# Altium integrated library WCAP-AIL8_rev15a.intlib: 34 symbols
Pins are listed as number, name and electrical type; pins without a type are passive.

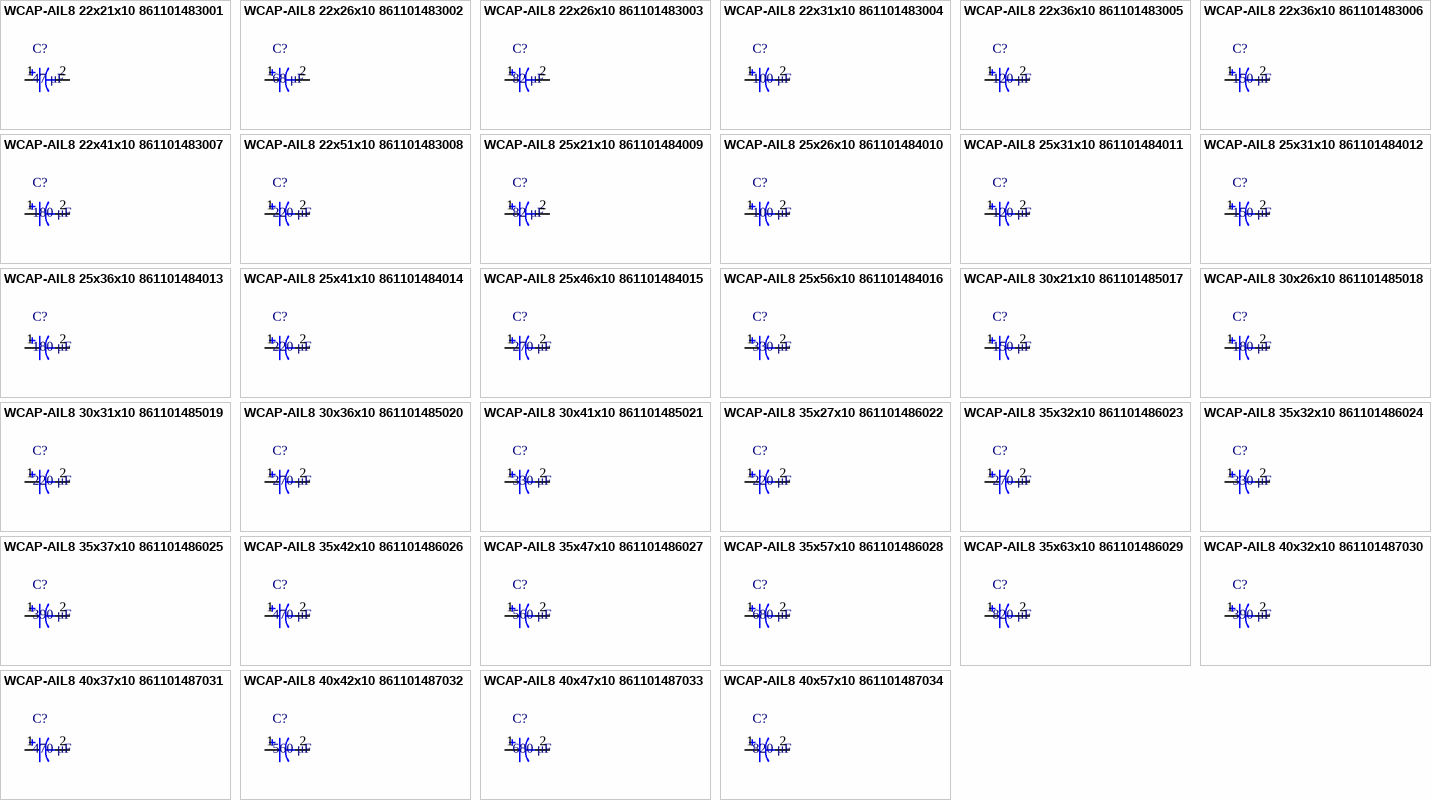
[diagram p0: symbols WCAP-AIL8 22x21x10 861101483001 to WCAP-AIL8 40x57x10 861101487034]

## WCAP-AIL8 22x21x10 861101483001
designator C?, comment 47 μF
WCAP-AIL8 Aluminum Electrolytic Capacitors , 47 μF; + / - 20%; 450 V , 22 x 21; Manufacturer: Wurth Elektronik; partNo: 861101483001; E-mail: libraries@we-online.com; Characteristics: Aluminum Electrolytic Capacitor; Recommended soldering: Wave; Operating temperature: –25 °C to +85 °C; Miniaturized product series; Load life: 2000 h @ +85 °C; ComponentLink1Description: Manufacturer; ComponentLink1URL: http://www.we-online.com; ComponentLink2Description: Datasheet; ComponentLink2URL: http://katalog.we-online.de/pbs/datasheet/861101483001.pdf; Created by: Karrer Zheng; Created Date: 6/8/2015; Capacitance: 47 μF; Application: Medium and high voltage type range from 160V-450V used as primary side input filter in power supply, which can be used in general switching power supply, PC power supply and industrial computer power supply,server power supply, AC-DC converter, motor drive circuit DC storage filter, digital audio, digital TV, communication base station, DC-AC inverter, inverter power supply and converters etc
footprint WCAP-AIL8 22x21x10
pins: 1, 2

## WCAP-AIL8 22x26x10 861101483002
designator C?, comment 68 μF
WCAP-AIL8 Aluminum Electrolytic Capacitors , 68 μF; + / - 20%; 450 V , 22 x 26; Manufacturer: Wurth Elektronik; partNo: 861101483002; E-mail: libraries@we-online.com; Characteristics: Aluminum Electrolytic Capacitor; Recommended soldering: Wave; Operating temperature: –25 °C to +85 °C; Miniaturized product series; Load life: 2000 h @ +85 °C; ComponentLink1Description: Manufacturer; ComponentLink1URL: http://www.we-online.com; ComponentLink2Description: Datasheet; ComponentLink2URL: http://katalog.we-online.de/pbs/datasheet/861101483002.pdf; Created by: Karrer Zheng; Created Date: 6/8/2015; Capacitance: 68 μF; Application: Medium and high voltage type range from 160V-450V used as primary side input filter in power supply, which can be used in general switching power supply, PC power supply and industrial computer power supply,server power supply, AC-DC converter, motor drive circuit DC storage filter, digital audio, digital TV, communication base station, DC-AC inverter, inverter power supply and converters etc
footprint WCAP-AIL8 22x26x10
pins: 1, 2

## WCAP-AIL8 22x26x10 861101483003
designator C?, comment 82 μF
WCAP-AIL8 Aluminum Electrolytic Capacitors , 82 μF; + / - 20%; 450 V , 22 x 26; Manufacturer: Wurth Elektronik; partNo: 861101483003; E-mail: libraries@we-online.com; Characteristics: Aluminum Electrolytic Capacitor; Recommended soldering: Wave; Operating temperature: –25 °C to +85 °C; Miniaturized product series; Load life: 2000 h @ +85 °C; ComponentLink1Description: Manufacturer; ComponentLink1URL: http://www.we-online.com; ComponentLink2Description: Datasheet; ComponentLink2URL: http://katalog.we-online.de/pbs/datasheet/861101483003.pdf; Created by: Karrer Zheng; Created Date: 6/8/2015; Capacitance: 82 μF; Application: Medium and high voltage type range from 160V-450V used as primary side input filter in power supply, which can be used in general switching power supply, PC power supply and industrial computer power supply,server power supply, AC-DC converter, motor drive circuit DC storage filter, digital audio, digital TV, communication base station, DC-AC inverter, inverter power supply and converters etc
footprint WCAP-AIL8 22x26x10
pins: 1, 2

## WCAP-AIL8 22x31x10 861101483004
designator C?, comment 100 μF
WCAP-AIL8 Aluminum Electrolytic Capacitors , 100 μF; + / - 20%; 450 V , 22 x 31; Manufacturer: Wurth Elektronik; partNo: 861101483004; E-mail: libraries@we-online.com; Characteristics: Aluminum Electrolytic Capacitor; Recommended soldering: Wave; Operating temperature: –25 °C to +85 °C; Miniaturized product series; Load life: 2000 h @ +85 °C; ComponentLink1Description: Manufacturer; ComponentLink1URL: http://www.we-online.com; ComponentLink2Description: Datasheet; ComponentLink2URL: http://katalog.we-online.de/pbs/datasheet/861101483004.pdf; Created by: Karrer Zheng; Created Date: 6/8/2015; Capacitance: 100 μF; Application: Medium and high voltage type range from 160V-450V used as primary side input filter in power supply, which can be used in general switching power supply, PC power supply and industrial computer power supply,server power supply, AC-DC converter, motor drive circuit DC storage filter, digital audio, digital TV, communication base station, DC-AC inverter, inverter power supply and converters etc
footprint WCAP-AIL8 22x31x10
pins: 1, 2

## WCAP-AIL8 22x36x10 861101483005
designator C?, comment 120 μF
WCAP-AIL8 Aluminum Electrolytic Capacitors , 120 μF; + / - 20%; 450 V , 22 x 36; Manufacturer: Wurth Elektronik; partNo: 861101483005; E-mail: libraries@we-online.com; Characteristics: Aluminum Electrolytic Capacitor; Recommended soldering: Wave; Operating temperature: –25 °C to +85 °C; Miniaturized product series; Load life: 2000 h @ +85 °C; ComponentLink1Description: Manufacturer; ComponentLink1URL: http://www.we-online.com; ComponentLink2Description: Datasheet; ComponentLink2URL: http://katalog.we-online.de/pbs/datasheet/861101483005.pdf; Created by: Karrer Zheng; Created Date: 6/8/2015; Capacitance: 120 μF; Application: Medium and high voltage type range from 160V-450V used as primary side input filter in power supply, which can be used in general switching power supply, PC power supply and industrial computer power supply,server power supply, AC-DC converter, motor drive circuit DC storage filter, digital audio, digital TV, communication base station, DC-AC inverter, inverter power supply and converters etc
footprint WCAP-AIL8 22x36x10
pins: 1, 2

## WCAP-AIL8 22x36x10 861101483006
designator C?, comment 150 μF
WCAP-AIL8 Aluminum Electrolytic Capacitors , 150 μF; + / - 20%; 450 V , 22 x 36; Manufacturer: Wurth Elektronik; partNo: 861101483006; E-mail: libraries@we-online.com; Characteristics: Aluminum Electrolytic Capacitor; Recommended soldering: Wave; Operating temperature: –25 °C to +85 °C; Miniaturized product series; Load life: 2000 h @ +85 °C; ComponentLink1Description: Manufacturer; ComponentLink1URL: http://www.we-online.com; ComponentLink2Description: Datasheet; ComponentLink2URL: http://katalog.we-online.de/pbs/datasheet/861101483006.pdf; Created by: Karrer Zheng; Created Date: 6/8/2015; Capacitance: 150 μF; Application: Medium and high voltage type range from 160V-450V used as primary side input filter in power supply, which can be used in general switching power supply, PC power supply and industrial computer power supply,server power supply, AC-DC converter, motor drive circuit DC storage filter, digital audio, digital TV, communication base station, DC-AC inverter, inverter power supply and converters etc
footprint WCAP-AIL8 22x36x10
pins: 1, 2

## WCAP-AIL8 22x41x10 861101483007
designator C?, comment 180 μF
WCAP-AIL8 Aluminum Electrolytic Capacitors , 180 μF; + / - 20%; 450 V , 22 x 41; Manufacturer: Wurth Elektronik; partNo: 861101483007; E-mail: libraries@we-online.com; Characteristics: Aluminum Electrolytic Capacitor; Recommended soldering: Wave; Operating temperature: –25 °C to +85 °C; Miniaturized product series; Load life: 2000 h @ +85 °C; ComponentLink1Description: Manufacturer; ComponentLink1URL: http://www.we-online.com; ComponentLink2Description: Datasheet; ComponentLink2URL: http://katalog.we-online.de/pbs/datasheet/861101483007.pdf; Created by: Karrer Zheng; Created Date: 6/8/2015; Capacitance: 180 μF; Application: Medium and high voltage type range from 160V-450V used as primary side input filter in power supply, which can be used in general switching power supply, PC power supply and industrial computer power supply,server power supply, AC-DC converter, motor drive circuit DC storage filter, digital audio, digital TV, communication base station, DC-AC inverter, inverter power supply and converters etc
footprint WCAP-AIL8 22x41x10
pins: 1, 2

## WCAP-AIL8 22x51x10 861101483008
designator C?, comment 220 μF
WCAP-AIL8 Aluminum Electrolytic Capacitors , 220 μF; + / - 20%; 450 V , 22 x 51; Manufacturer: Wurth Elektronik; partNo: 861101483008; E-mail: libraries@we-online.com; Characteristics: Aluminum Electrolytic Capacitor; Recommended soldering: Wave; Operating temperature: –25 °C to +85 °C; Miniaturized product series; Load life: 2000 h @ +85 °C; ComponentLink1Description: Manufacturer; ComponentLink1URL: http://www.we-online.com; ComponentLink2Description: Datasheet; ComponentLink2URL: http://katalog.we-online.de/pbs/datasheet/861101483008.pdf; Created by: Karrer Zheng; Created Date: 6/8/2015; Capacitance: 220 μF; Application: Medium and high voltage type range from 160V-450V used as primary side input filter in power supply, which can be used in general switching power supply, PC power supply and industrial computer power supply,server power supply, AC-DC converter, motor drive circuit DC storage filter, digital audio, digital TV, communication base station, DC-AC inverter, inverter power supply and converters etc
footprint WCAP-AIL8 22x51x10
pins: 1, 2

## WCAP-AIL8 25x21x10 861101484009
designator C?, comment 82 μF
WCAP-AIL8 Aluminum Electrolytic Capacitors , 82 μF; + / - 20%; 450 V , 25 x 21; Manufacturer: Wurth Elektronik; partNo: 861101484009; E-mail: libraries@we-online.com; Characteristics: Aluminum Electrolytic Capacitor; Recommended soldering: Wave; Operating temperature: –25 °C to +85 °C; Miniaturized product series; Load life: 2000 h @ +85 °C; ComponentLink1Description: Manufacturer; ComponentLink1URL: http://www.we-online.com; ComponentLink2Description: Datasheet; ComponentLink2URL: http://katalog.we-online.de/pbs/datasheet/861101484009.pdf; Created by: Karrer Zheng; Created Date: 6/8/2015; Capacitance: 82 μF; Application: Medium and high voltage type range from 160V-450V used as primary side input filter in power supply, which can be used in general switching power supply, PC power supply and industrial computer power supply,server power supply, AC-DC converter, motor drive circuit DC storage filter, digital audio, digital TV, communication base station, DC-AC inverter, inverter power supply and converters etc
footprint WCAP-AIL8 25x21x10
pins: 1, 2

## WCAP-AIL8 25x26x10 861101484010
designator C?, comment 100 μF
WCAP-AIL8 Aluminum Electrolytic Capacitors , 100 μF; + / - 20%; 450 V , 25 x 26; Manufacturer: Wurth Elektronik; partNo: 861101484010; E-mail: libraries@we-online.com; Characteristics: Aluminum Electrolytic Capacitor; Recommended soldering: Wave; Operating temperature: –25 °C to +85 °C; Miniaturized product series; Load life: 2000 h @ +85 °C; ComponentLink1Description: Manufacturer; ComponentLink1URL: http://www.we-online.com; ComponentLink2Description: Datasheet; ComponentLink2URL: http://katalog.we-online.de/pbs/datasheet/861101484010.pdf; Created by: Karrer Zheng; Created Date: 6/8/2015; Capacitance: 100 μF; Application: Medium and high voltage type range from 160V-450V used as primary side input filter in power supply, which can be used in general switching power supply, PC power supply and industrial computer power supply,server power supply, AC-DC converter, motor drive circuit DC storage filter, digital audio, digital TV, communication base station, DC-AC inverter, inverter power supply and converters etc
footprint WCAP-AIL8 25x26x10
pins: 1, 2

## WCAP-AIL8 25x31x10 861101484011
designator C?, comment 120 μF
WCAP-AIL8 Aluminum Electrolytic Capacitors , 120 μF; + / - 20%; 450 V , 25 x 31; Manufacturer: Wurth Elektronik; partNo: 861101484011; E-mail: libraries@we-online.com; Characteristics: Aluminum Electrolytic Capacitor; Recommended soldering: Wave; Operating temperature: –25 °C to +85 °C; Miniaturized product series; Load life: 2000 h @ +85 °C; ComponentLink1Description: Manufacturer; ComponentLink1URL: http://www.we-online.com; ComponentLink2Description: Datasheet; ComponentLink2URL: http://katalog.we-online.de/pbs/datasheet/861101484011.pdf; Created by: Karrer Zheng; Created Date: 6/8/2015; Capacitance: 120 μF; Application: Medium and high voltage type range from 160V-450V used as primary side input filter in power supply, which can be used in general switching power supply, PC power supply and industrial computer power supply,server power supply, AC-DC converter, motor drive circuit DC storage filter, digital audio, digital TV, communication base station, DC-AC inverter, inverter power supply and converters etc
footprint WCAP-AIL8 25x31x10
pins: 1, 2

## WCAP-AIL8 25x31x10 861101484012
designator C?, comment 150 μF
WCAP-AIL8 Aluminum Electrolytic Capacitors , 150 μF; + / - 20%; 450 V , 25 x 31; Manufacturer: Wurth Elektronik; partNo: 861101484012; E-mail: libraries@we-online.com; Characteristics: Aluminum Electrolytic Capacitor; Recommended soldering: Wave; Operating temperature: –25 °C to +85 °C; Miniaturized product series; Load life: 2000 h @ +85 °C; ComponentLink1Description: Manufacturer; ComponentLink1URL: http://www.we-online.com; ComponentLink2Description: Datasheet; ComponentLink2URL: http://katalog.we-online.de/pbs/datasheet/861101484012.pdf; Created by: Karrer Zheng; Created Date: 6/8/2015; Capacitance: 150 μF; Application: Medium and high voltage type range from 160V-450V used as primary side input filter in power supply, which can be used in general switching power supply, PC power supply and industrial computer power supply,server power supply, AC-DC converter, motor drive circuit DC storage filter, digital audio, digital TV, communication base station, DC-AC inverter, inverter power supply and converters etc
footprint WCAP-AIL8 25x31x10
pins: 1, 2

## WCAP-AIL8 25x36x10 861101484013
designator C?, comment 180 μF
WCAP-AIL8 Aluminum Electrolytic Capacitors , 180 μF; + / - 20%; 450 V , 25 x 36; Manufacturer: Wurth Elektronik; partNo: 861101484013; E-mail: libraries@we-online.com; Characteristics: Aluminum Electrolytic Capacitor; Recommended soldering: Wave; Operating temperature: –25 °C to +85 °C; Miniaturized product series; Load life: 2000 h @ +85 °C; ComponentLink1Description: Manufacturer; ComponentLink1URL: http://www.we-online.com; ComponentLink2Description: Datasheet; ComponentLink2URL: http://katalog.we-online.de/pbs/datasheet/861101484013.pdf; Created by: Karrer Zheng; Created Date: 6/8/2015; Capacitance: 180 μF; Application: Medium and high voltage type range from 160V-450V used as primary side input filter in power supply, which can be used in general switching power supply, PC power supply and industrial computer power supply,server power supply, AC-DC converter, motor drive circuit DC storage filter, digital audio, digital TV, communication base station, DC-AC inverter, inverter power supply and converters etc
footprint WCAP-AIL8 25x36x10
pins: 1, 2

## WCAP-AIL8 25x41x10 861101484014
designator C?, comment 220 μF
WCAP-AIL8 Aluminum Electrolytic Capacitors , 220 μF; + / - 20%; 450 V , 25 x 41; Manufacturer: Wurth Elektronik; partNo: 861101484014; E-mail: libraries@we-online.com; Characteristics: Aluminum Electrolytic Capacitor; Recommended soldering: Wave; Operating temperature: –25 °C to +85 °C; Miniaturized product series; Load life: 2000 h @ +85 °C; ComponentLink1Description: Manufacturer; ComponentLink1URL: http://www.we-online.com; ComponentLink2Description: Datasheet; ComponentLink2URL: http://katalog.we-online.de/pbs/datasheet/861101484014.pdf; Created by: Karrer Zheng; Created Date: 6/8/2015; Capacitance: 220 μF; Application: Medium and high voltage type range from 160V-450V used as primary side input filter in power supply, which can be used in general switching power supply, PC power supply and industrial computer power supply,server power supply, AC-DC converter, motor drive circuit DC storage filter, digital audio, digital TV, communication base station, DC-AC inverter, inverter power supply and converters etc
footprint WCAP-AIL8 25x41x10
pins: 1, 2

## WCAP-AIL8 25x46x10 861101484015
designator C?, comment 270 μF
WCAP-AIL8 Aluminum Electrolytic Capacitors , 270 μF; + / - 20%; 450 V , 25 x 46; Manufacturer: Wurth Elektronik; partNo: 861101484015; E-mail: libraries@we-online.com; Characteristics: Aluminum Electrolytic Capacitor; Recommended soldering: Wave; Operating temperature: –25 °C to +85 °C; Miniaturized product series; Load life: 2000 h @ +85 °C; ComponentLink1Description: Manufacturer; ComponentLink1URL: http://www.we-online.com; ComponentLink2Description: Datasheet; ComponentLink2URL: http://katalog.we-online.de/pbs/datasheet/861101484015.pdf; Created by: Karrer Zheng; Created Date: 6/8/2015; Capacitance: 270 μF; Application: Medium and high voltage type range from 160V-450V used as primary side input filter in power supply, which can be used in general switching power supply, PC power supply and industrial computer power supply,server power supply, AC-DC converter, motor drive circuit DC storage filter, digital audio, digital TV, communication base station, DC-AC inverter, inverter power supply and converters etc
footprint WCAP-AIL8 25x46x10
pins: 1, 2

## WCAP-AIL8 25x56x10 861101484016
designator C?, comment 330 μF
WCAP-AIL8 Aluminum Electrolytic Capacitors , 330 μF; + / - 20%; 450 V , 25 x 56; Manufacturer: Wurth Elektronik; partNo: 861101484016; E-mail: libraries@we-online.com; Characteristics: Aluminum Electrolytic Capacitor; Recommended soldering: Wave; Operating temperature: –25 °C to +85 °C; Miniaturized product series; Load life: 2000 h @ +85 °C; ComponentLink1Description: Manufacturer; ComponentLink1URL: http://www.we-online.com; ComponentLink2Description: Datasheet; ComponentLink2URL: http://katalog.we-online.de/pbs/datasheet/861101484016.pdf; Created by: Karrer Zheng; Created Date: 6/8/2015; Capacitance: 330 μF; Application: Medium and high voltage type range from 160V-450V used as primary side input filter in power supply, which can be used in general switching power supply, PC power supply and industrial computer power supply,server power supply, AC-DC converter, motor drive circuit DC storage filter, digital audio, digital TV, communication base station, DC-AC inverter, inverter power supply and converters etc
footprint WCAP-AIL8 25x56x10
pins: 1, 2

## WCAP-AIL8 30x21x10 861101485017
designator C?, comment 150 μF
WCAP-AIL8 Aluminum Electrolytic Capacitors , 150 μF; + / - 20%; 450 V , 30 x 21; Manufacturer: Wurth Elektronik; partNo: 861101485017; E-mail: libraries@we-online.com; Characteristics: Aluminum Electrolytic Capacitor; Recommended soldering: Wave; Operating temperature: –25 °C to +85 °C; Miniaturized product series; Load life: 2000 h @ +85 °C; ComponentLink1Description: Manufacturer; ComponentLink1URL: http://www.we-online.com; ComponentLink2Description: Datasheet; ComponentLink2URL: http://katalog.we-online.de/pbs/datasheet/861101485017.pdf; Created by: Karrer Zheng; Created Date: 6/8/2015; Capacitance: 150 μF; Application: Medium and high voltage type range from 160V-450V used as primary side input filter in power supply, which can be used in general switching power supply, PC power supply and industrial computer power supply,server power supply, AC-DC converter, motor drive circuit DC storage filter, digital audio, digital TV, communication base station, DC-AC inverter, inverter power supply and converters etc
footprint WCAP-AIL8 30x21x10
pins: 1, 2

## WCAP-AIL8 30x26x10 861101485018
designator C?, comment 180 μF
WCAP-AIL8 Aluminum Electrolytic Capacitors , 180 μF; + / - 20%; 450 V , 30 x 26; Manufacturer: Wurth Elektronik; partNo: 861101485018; E-mail: libraries@we-online.com; Characteristics: Aluminum Electrolytic Capacitor; Recommended soldering: Wave; Operating temperature: –25 °C to +85 °C; Miniaturized product series; Load life: 2000 h @ +85 °C; ComponentLink1Description: Manufacturer; ComponentLink1URL: http://www.we-online.com; ComponentLink2Description: Datasheet; ComponentLink2URL: http://katalog.we-online.de/pbs/datasheet/861101485018.pdf; Created by: Karrer Zheng; Created Date: 6/8/2015; Capacitance: 180 μF; Application: Medium and high voltage type range from 160V-450V used as primary side input filter in power supply, which can be used in general switching power supply, PC power supply and industrial computer power supply,server power supply, AC-DC converter, motor drive circuit DC storage filter, digital audio, digital TV, communication base station, DC-AC inverter, inverter power supply and converters etc
footprint WCAP-AIL8 30x26x10
pins: 1, 2

## WCAP-AIL8 30x31x10 861101485019
designator C?, comment 220 μF
WCAP-AIL8 Aluminum Electrolytic Capacitors , 220 μF; + / - 20%; 450 V , 30 x 31; Manufacturer: Wurth Elektronik; partNo: 861101485019; E-mail: libraries@we-online.com; Characteristics: Aluminum Electrolytic Capacitor; Recommended soldering: Wave; Operating temperature: –25 °C to +85 °C; Miniaturized product series; Load life: 2000 h @ +85 °C; ComponentLink1Description: Manufacturer; ComponentLink1URL: http://www.we-online.com; ComponentLink2Description: Datasheet; ComponentLink2URL: http://katalog.we-online.de/pbs/datasheet/861101485019.pdf; Created by: Karrer Zheng; Created Date: 6/8/2015; Capacitance: 220 μF; Application: Medium and high voltage type range from 160V-450V used as primary side input filter in power supply, which can be used in general switching power supply, PC power supply and industrial computer power supply,server power supply, AC-DC converter, motor drive circuit DC storage filter, digital audio, digital TV, communication base station, DC-AC inverter, inverter power supply and converters etc
footprint WCAP-AIL8 30x31x10
pins: 1, 2

## WCAP-AIL8 30x36x10 861101485020
designator C?, comment 270 μF
WCAP-AIL8 Aluminum Electrolytic Capacitors , 270 μF; + / - 20%; 450 V , 30 x 36; Manufacturer: Wurth Elektronik; partNo: 861101485020; E-mail: libraries@we-online.com; Characteristics: Aluminum Electrolytic Capacitor; Recommended soldering: Wave; Operating temperature: –25 °C to +85 °C; Miniaturized product series; Load life: 2000 h @ +85 °C; ComponentLink1Description: Manufacturer; ComponentLink1URL: http://www.we-online.com; ComponentLink2Description: Datasheet; ComponentLink2URL: http://katalog.we-online.de/pbs/datasheet/861101485020.pdf; Created by: Karrer Zheng; Created Date: 6/8/2015; Capacitance: 270 μF; Application: Medium and high voltage type range from 160V-450V used as primary side input filter in power supply, which can be used in general switching power supply, PC power supply and industrial computer power supply,server power supply, AC-DC converter, motor drive circuit DC storage filter, digital audio, digital TV, communication base station, DC-AC inverter, inverter power supply and converters etc
footprint WCAP-AIL8 30x36x10
pins: 1, 2

## WCAP-AIL8 30x41x10 861101485021
designator C?, comment 330 μF
WCAP-AIL8 Aluminum Electrolytic Capacitors , 330 μF; + / - 20%; 450 V , 30 x 41; Manufacturer: Wurth Elektronik; partNo: 861101485021; E-mail: libraries@we-online.com; Characteristics: Aluminum Electrolytic Capacitor; Recommended soldering: Wave; Operating temperature: –25 °C to +85 °C; Miniaturized product series; Load life: 2000 h @ +85 °C; ComponentLink1Description: Manufacturer; ComponentLink1URL: http://www.we-online.com; ComponentLink2Description: Datasheet; ComponentLink2URL: http://katalog.we-online.de/pbs/datasheet/861101485021.pdf; Created by: Karrer Zheng; Created Date: 6/8/2015; Capacitance: 330 μF; Application: Medium and high voltage type range from 160V-450V used as primary side input filter in power supply, which can be used in general switching power supply, PC power supply and industrial computer power supply,server power supply, AC-DC converter, motor drive circuit DC storage filter, digital audio, digital TV, communication base station, DC-AC inverter, inverter power supply and converters etc
footprint WCAP-AIL8 30x41x10
pins: 1, 2

## WCAP-AIL8 35x27x10 861101486022
designator C?, comment 220 μF
WCAP-AIL8 Aluminum Electrolytic Capacitors , 220 μF; + / - 20%; 450 V , 35 x 27; Manufacturer: Wurth Elektronik; partNo: 861101486022; E-mail: libraries@we-online.com; Characteristics: Aluminum Electrolytic Capacitor; Recommended soldering: Wave; Operating temperature: –25 °C to +85 °C; Miniaturized product series; Load life: 2000 h @ +85 °C; ComponentLink1Description: Manufacturer; ComponentLink1URL: http://www.we-online.com; ComponentLink2Description: Datasheet; ComponentLink2URL: http://katalog.we-online.de/pbs/datasheet/861101486022.pdf; Created by: Karrer Zheng; Created Date: 6/8/2015; Capacitance: 220 μF; Application: Medium and high voltage type range from 160V-450V used as primary side input filter in power supply, which can be used in general switching power supply, PC power supply and industrial computer power supply,server power supply, AC-DC converter, motor drive circuit DC storage filter, digital audio, digital TV, communication base station, DC-AC inverter, inverter power supply and converters etc
footprint WCAP-AIL8 35x27x10
pins: 1, 2

## WCAP-AIL8 35x32x10 861101486023
designator C?, comment 270 μF
WCAP-AIL8 Aluminum Electrolytic Capacitors , 270 μF; + / - 20%; 450 V , 35 x 32; Manufacturer: Wurth Elektronik; partNo: 861101486023; E-mail: libraries@we-online.com; Characteristics: Aluminum Electrolytic Capacitor; Recommended soldering: Wave; Operating temperature: –25 °C to +85 °C; Miniaturized product series; Load life: 2000 h @ +85 °C; ComponentLink1Description: Manufacturer; ComponentLink1URL: http://www.we-online.com; ComponentLink2Description: Datasheet; ComponentLink2URL: http://katalog.we-online.de/pbs/datasheet/861101486023.pdf; Created by: Karrer Zheng; Created Date: 6/8/2015; Capacitance: 270 μF; Application: Medium and high voltage type range from 160V-450V used as primary side input filter in power supply, which can be used in general switching power supply, PC power supply and industrial computer power supply,server power supply, AC-DC converter, motor drive circuit DC storage filter, digital audio, digital TV, communication base station, DC-AC inverter, inverter power supply and converters etc
footprint WCAP-AIL8 35x32x10
pins: 1, 2

## WCAP-AIL8 35x32x10 861101486024
designator C?, comment 330 μF
WCAP-AIL8 Aluminum Electrolytic Capacitors , 330 μF; + / - 20%; 450 V , 35 x 32; Manufacturer: Wurth Elektronik; partNo: 861101486024; E-mail: libraries@we-online.com; Characteristics: Aluminum Electrolytic Capacitor; Recommended soldering: Wave; Operating temperature: –25 °C to +85 °C; Miniaturized product series; Load life: 2000 h @ +85 °C; ComponentLink1Description: Manufacturer; ComponentLink1URL: http://www.we-online.com; ComponentLink2Description: Datasheet; ComponentLink2URL: http://katalog.we-online.de/pbs/datasheet/861101486024.pdf; Created by: Karrer Zheng; Created Date: 6/8/2015; Capacitance: 330 μF; Application: Medium and high voltage type range from 160V-450V used as primary side input filter in power supply, which can be used in general switching power supply, PC power supply and industrial computer power supply,server power supply, AC-DC converter, motor drive circuit DC storage filter, digital audio, digital TV, communication base station, DC-AC inverter, inverter power supply and converters etc
footprint WCAP-AIL8 35x32x10
pins: 1, 2

## WCAP-AIL8 35x37x10 861101486025
designator C?, comment 390 μF
WCAP-AIL8 Aluminum Electrolytic Capacitors , 390 μF; + / - 20%; 450 V , 35 x 37; Manufacturer: Wurth Elektronik; partNo: 861101486025; E-mail: libraries@we-online.com; Characteristics: Aluminum Electrolytic Capacitor; Recommended soldering: Wave; Operating temperature: –25 °C to +85 °C; Miniaturized product series; Load life: 2000 h @ +85 °C; ComponentLink1Description: Manufacturer; ComponentLink1URL: http://www.we-online.com; ComponentLink2Description: Datasheet; ComponentLink2URL: http://katalog.we-online.de/pbs/datasheet/861101486025.pdf; Created by: Karrer Zheng; Created Date: 6/8/2015; Capacitance: 390 μF; Application: Medium and high voltage type range from 160V-450V used as primary side input filter in power supply, which can be used in general switching power supply, PC power supply and industrial computer power supply,server power supply, AC-DC converter, motor drive circuit DC storage filter, digital audio, digital TV, communication base station, DC-AC inverter, inverter power supply and converters etc
footprint WCAP-AIL8 35x37x10
pins: 1, 2

## WCAP-AIL8 35x42x10 861101486026
designator C?, comment 470 μF
WCAP-AIL8 Aluminum Electrolytic Capacitors , 470 μF; + / - 20%; 450 V , 35 x 42; Manufacturer: Wurth Elektronik; partNo: 861101486026; E-mail: libraries@we-online.com; Characteristics: Aluminum Electrolytic Capacitor; Recommended soldering: Wave; Operating temperature: –25 °C to +85 °C; Miniaturized product series; Load life: 2000 h @ +85 °C; ComponentLink1Description: Manufacturer; ComponentLink1URL: http://www.we-online.com; ComponentLink2Description: Datasheet; ComponentLink2URL: http://katalog.we-online.de/pbs/datasheet/861101486026.pdf; Created by: Karrer Zheng; Created Date: 6/8/2015; Capacitance: 470 μF; Application: Medium and high voltage type range from 160V-450V used as primary side input filter in power supply, which can be used in general switching power supply, PC power supply and industrial computer power supply,server power supply, AC-DC converter, motor drive circuit DC storage filter, digital audio, digital TV, communication base station, DC-AC inverter, inverter power supply and converters etc
footprint WCAP-AIL8 35x42x10
pins: 1, 2

## WCAP-AIL8 35x47x10 861101486027
designator C?, comment 560 μF
WCAP-AIL8 Aluminum Electrolytic Capacitors , 560 μF; + / - 20%; 450 V , 35 x 47; Manufacturer: Wurth Elektronik; partNo: 861101486027; E-mail: libraries@we-online.com; Characteristics: Aluminum Electrolytic Capacitor; Recommended soldering: Wave; Operating temperature: –25 °C to +85 °C; Miniaturized product series; Load life: 2000 h @ +85 °C; ComponentLink1Description: Manufacturer; ComponentLink1URL: http://www.we-online.com; ComponentLink2Description: Datasheet; ComponentLink2URL: http://katalog.we-online.de/pbs/datasheet/861101486027.pdf; Created by: Karrer Zheng; Created Date: 6/8/2015; Capacitance: 560 μF; Application: Medium and high voltage type range from 160V-450V used as primary side input filter in power supply, which can be used in general switching power supply, PC power supply and industrial computer power supply,server power supply, AC-DC converter, motor drive circuit DC storage filter, digital audio, digital TV, communication base station, DC-AC inverter, inverter power supply and converters etc
footprint WCAP-AIL8 35x47x10
pins: 1, 2

## WCAP-AIL8 35x57x10 861101486028
designator C?, comment 680 μF
WCAP-AIL8 Aluminum Electrolytic Capacitors , 680 μF; + / - 20%; 450 V , 35 x 57; Manufacturer: Wurth Elektronik; partNo: 861101486028; E-mail: libraries@we-online.com; Characteristics: Aluminum Electrolytic Capacitor; Recommended soldering: Wave; Operating temperature: –25 °C to +85 °C; Miniaturized product series; Load life: 2000 h @ +85 °C; ComponentLink1Description: Manufacturer; ComponentLink1URL: http://www.we-online.com; ComponentLink2Description: Datasheet; ComponentLink2URL: http://katalog.we-online.de/pbs/datasheet/861101486028.pdf; Created by: Karrer Zheng; Created Date: 6/8/2015; Capacitance: 680 μF; Application: Medium and high voltage type range from 160V-450V used as primary side input filter in power supply, which can be used in general switching power supply, PC power supply and industrial computer power supply,server power supply, AC-DC converter, motor drive circuit DC storage filter, digital audio, digital TV, communication base station, DC-AC inverter, inverter power supply and converters etc
footprint WCAP-AIL8 35x57x10
pins: 1, 2

## WCAP-AIL8 35x63x10 861101486029
designator C?, comment 820 μF
WCAP-AIL8 Aluminum Electrolytic Capacitors , 820 μF; + / - 20%; 450 V , 35 x 63; Manufacturer: Wurth Elektronik; partNo: 861101486029; E-mail: libraries@we-online.com; Characteristics: Aluminum Electrolytic Capacitor; Recommended soldering: Wave; Operating temperature: –25 °C to +85 °C; Miniaturized product series; Load life: 2000 h @ +85 °C; ComponentLink1Description: Manufacturer; ComponentLink1URL: http://www.we-online.com; ComponentLink2Description: Datasheet; ComponentLink2URL: http://katalog.we-online.de/pbs/datasheet/861101486029.pdf; Created by: Karrer Zheng; Created Date: 6/8/2015; Capacitance: 820 μF; Application: Medium and high voltage type range from 160V-450V used as primary side input filter in power supply, which can be used in general switching power supply, PC power supply and industrial computer power supply,server power supply, AC-DC converter, motor drive circuit DC storage filter, digital audio, digital TV, communication base station, DC-AC inverter, inverter power supply and converters etc
footprint WCAP-AIL8 35x63x10
pins: 1, 2

## WCAP-AIL8 40x32x10 861101487030
designator C?, comment 390 μF
WCAP-AIL8 Aluminum Electrolytic Capacitors , 390 μF; + / - 20%; 450 V , 40 x 32; Manufacturer: Wurth Elektronik; partNo: 861101487030; E-mail: libraries@we-online.com; Characteristics: Aluminum Electrolytic Capacitor; Recommended soldering: Wave; Operating temperature: –25 °C to +85 °C; Miniaturized product series; Load life: 2000 h @ +85 °C; ComponentLink1Description: Manufacturer; ComponentLink1URL: http://www.we-online.com; ComponentLink2Description: Datasheet; ComponentLink2URL: http://katalog.we-online.de/pbs/datasheet/861101487030.pdf; Created by: Karrer Zheng; Created Date: 6/8/2015; Capacitance: 390 μF; Application: Medium and high voltage type range from 160V-450V used as primary side input filter in power supply, which can be used in general switching power supply, PC power supply and industrial computer power supply,server power supply, AC-DC converter, motor drive circuit DC storage filter, digital audio, digital TV, communication base station, DC-AC inverter, inverter power supply and converters etc
footprint WCAP-AIL8 40x32x10
pins: 1, 2

## WCAP-AIL8 40x37x10 861101487031
designator C?, comment 470 μF
WCAP-AIL8 Aluminum Electrolytic Capacitors , 470 μF; + / - 20%; 450 V , 40 x 37; Manufacturer: Wurth Elektronik; partNo: 861101487031; E-mail: libraries@we-online.com; Characteristics: Aluminum Electrolytic Capacitor; Recommended soldering: Wave; Operating temperature: –25 °C to +85 °C; Miniaturized product series; Load life: 2000 h @ +85 °C; ComponentLink1Description: Manufacturer; ComponentLink1URL: http://www.we-online.com; ComponentLink2Description: Datasheet; ComponentLink2URL: http://katalog.we-online.de/pbs/datasheet/861101487031.pdf; Created by: Karrer Zheng; Created Date: 6/8/2015; Capacitance: 470 μF; Application: Medium and high voltage type range from 160V-450V used as primary side input filter in power supply, which can be used in general switching power supply, PC power supply and industrial computer power supply,server power supply, AC-DC converter, motor drive circuit DC storage filter, digital audio, digital TV, communication base station, DC-AC inverter, inverter power supply and converters etc
footprint WCAP-AIL8 40x37x10
pins: 1, 2

## WCAP-AIL8 40x42x10 861101487032
designator C?, comment 560 μF
WCAP-AIL8 Aluminum Electrolytic Capacitors , 560 μF; + / - 20%; 450 V , 40 x 42; Manufacturer: Wurth Elektronik; partNo: 861101487032; E-mail: libraries@we-online.com; Characteristics: Aluminum Electrolytic Capacitor; Recommended soldering: Wave; Operating temperature: –25 °C to +85 °C; Miniaturized product series; Load life: 2000 h @ +85 °C; ComponentLink1Description: Manufacturer; ComponentLink1URL: http://www.we-online.com; ComponentLink2Description: Datasheet; ComponentLink2URL: http://katalog.we-online.de/pbs/datasheet/861101487032.pdf; Created by: Karrer Zheng; Created Date: 6/8/2015; Capacitance: 560 μF; Application: Medium and high voltage type range from 160V-450V used as primary side input filter in power supply, which can be used in general switching power supply, PC power supply and industrial computer power supply,server power supply, AC-DC converter, motor drive circuit DC storage filter, digital audio, digital TV, communication base station, DC-AC inverter, inverter power supply and converters etc
footprint WCAP-AIL8 40x42x10
pins: 1, 2

## WCAP-AIL8 40x47x10 861101487033
designator C?, comment 680 μF
WCAP-AIL8 Aluminum Electrolytic Capacitors , 680 μF; + / - 20%; 450 V , 40 x 47; Manufacturer: Wurth Elektronik; partNo: 861101487033; E-mail: libraries@we-online.com; Characteristics: Aluminum Electrolytic Capacitor; Recommended soldering: Wave; Operating temperature: –25 °C to +85 °C; Miniaturized product series; Load life: 2000 h @ +85 °C; ComponentLink1Description: Manufacturer; ComponentLink1URL: http://www.we-online.com; ComponentLink2Description: Datasheet; ComponentLink2URL: http://katalog.we-online.de/pbs/datasheet/861101487033.pdf; Created by: Karrer Zheng; Created Date: 6/8/2015; Capacitance: 680 μF; Application: Medium and high voltage type range from 160V-450V used as primary side input filter in power supply, which can be used in general switching power supply, PC power supply and industrial computer power supply,server power supply, AC-DC converter, motor drive circuit DC storage filter, digital audio, digital TV, communication base station, DC-AC inverter, inverter power supply and converters etc
footprint WCAP-AIL8 40x47x10
pins: 1, 2

## WCAP-AIL8 40x57x10 861101487034
designator C?, comment 820 μF
WCAP-AIL8 Aluminum Electrolytic Capacitors , 820 μF; + / - 20%; 450 V , 40 x 57; Manufacturer: Wurth Elektronik; partNo: 861101487034; E-mail: libraries@we-online.com; Characteristics: Aluminum Electrolytic Capacitor; Recommended soldering: Wave; Operating temperature: –25 °C to +85 °C; Miniaturized product series; Load life: 2000 h @ +85 °C; ComponentLink1Description: Manufacturer; ComponentLink1URL: http://www.we-online.com; ComponentLink2Description: Datasheet; ComponentLink2URL: http://katalog.we-online.de/pbs/datasheet/861101487034.pdf; Created by: Karrer Zheng; Created Date: 6/8/2015; Capacitance: 820 μF; Application: Medium and high voltage type range from 160V-450V used as primary side input filter in power supply, which can be used in general switching power supply, PC power supply and industrial computer power supply,server power supply, AC-DC converter, motor drive circuit DC storage filter, digital audio, digital TV, communication base station, DC-AC inverter, inverter power supply and converters etc
footprint WCAP-AIL8 40x57x10
pins: 1, 2